# Altium footprint library 430 integreted.PcbLib: 281 footprints (part 17 of 18)
Each footprint in its own frame and in the unit in brackets; x right, y up, seen from the top. Pads: shape width x height; smd on the part's side, far side on the other; paste and mask are expansions set on the pad; w line width, h text height; cw(c..) or ccw(c..) is an arc to the next point about the centre after c.
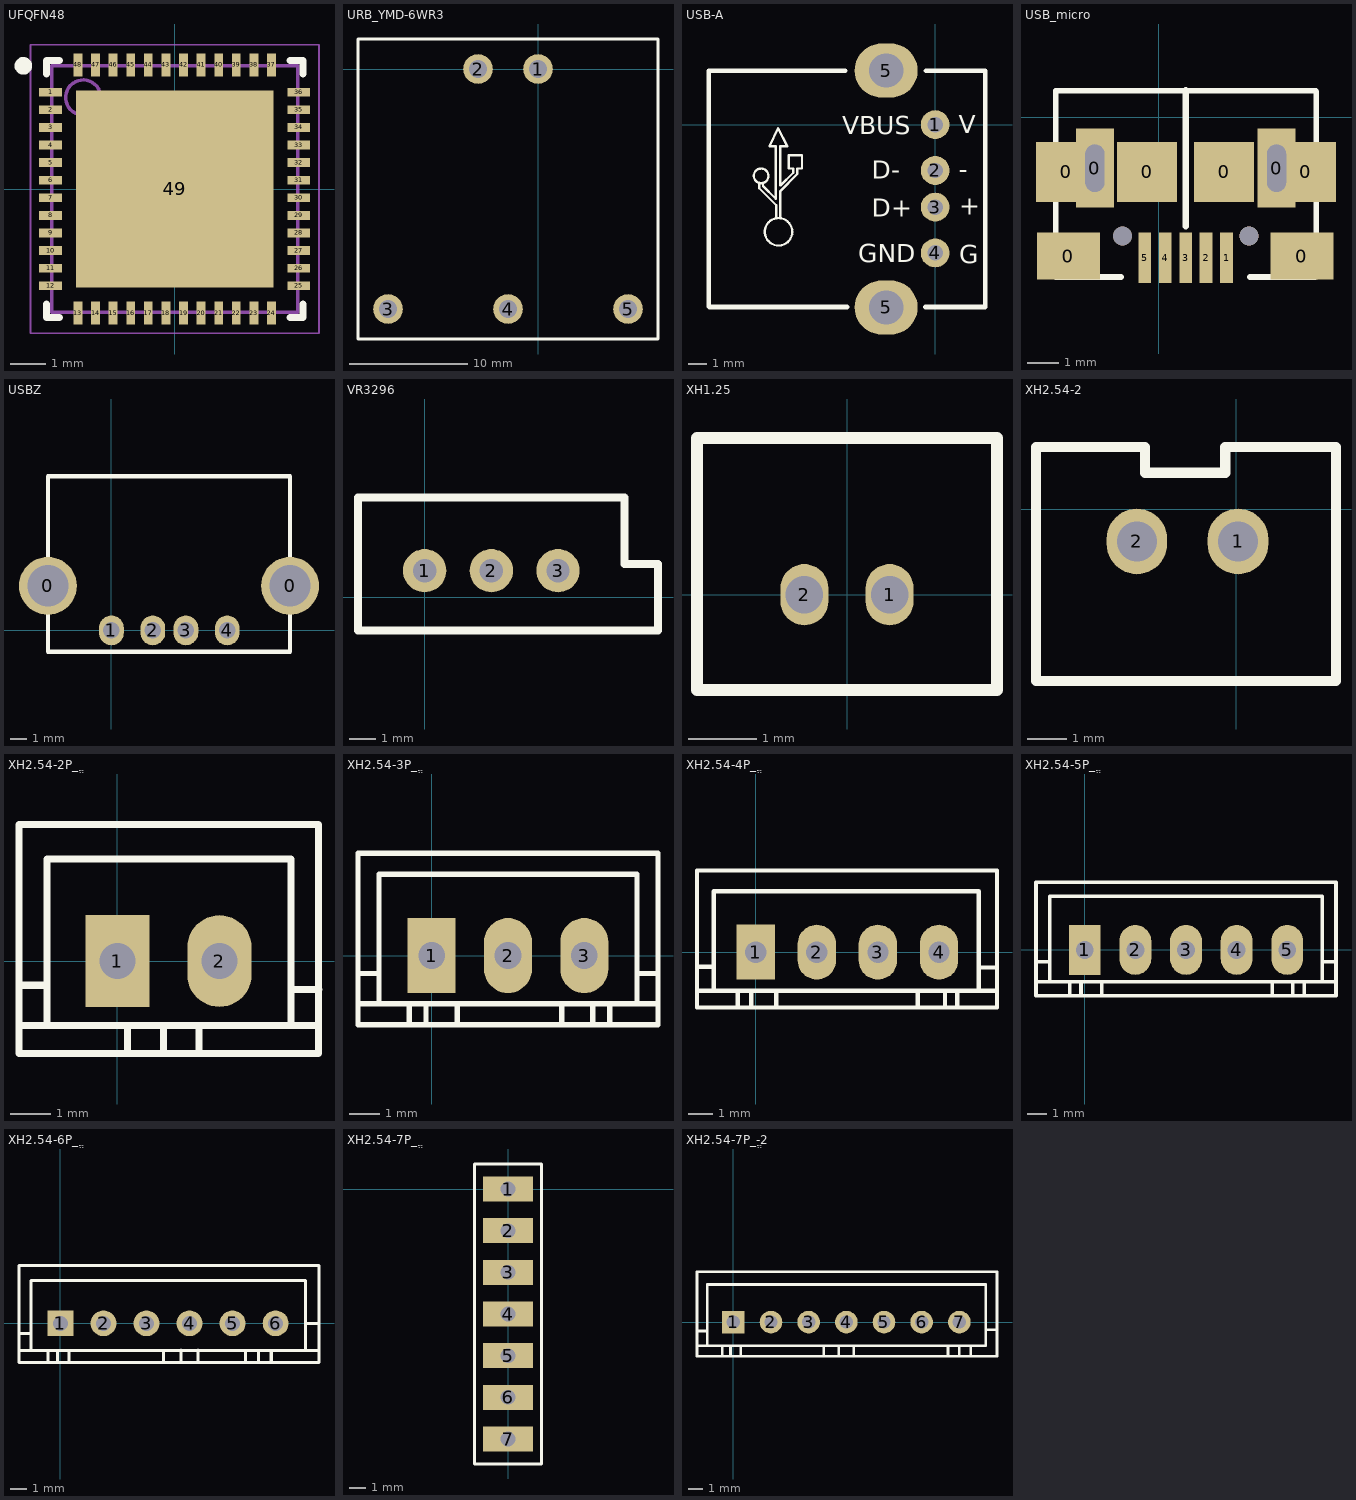
[diagram p16: the footprints below, top view; thin cyan lines are the x and y axes]

## UFQFN48 [mm]
pads (49):
  rect 0.65x0.25 smd: 1(-3.525,2.75) 2(-3.525,2.25) 3(-3.525,1.75) 4(-3.525,1.25) 5(-3.525,0.75) 6(-3.525,0.25) 7(-3.525,-0.25) 8(-3.525,-0.75) 9(-3.525,-1.25) 10(-3.525,-1.75) 11(-3.525,-2.25) 12(-3.525,-2.75) 25(3.525,-2.75) 26(3.525,-2.25) 27(3.525,-1.75) 28(3.525,-1.25) 29(3.525,-0.75) 30(3.525,-0.25) 31(3.525,0.25) 32(3.525,0.75) 33(3.525,1.25) 34(3.525,1.75) 35(3.525,2.25) 36(3.525,2.75)
  rect 0.25x0.65 smd: 13(-2.75,-3.525) 14(-2.25,-3.525) 15(-1.75,-3.525) 16(-1.25,-3.525) 17(-0.75,-3.525) 18(-0.25,-3.525) 19(0.25,-3.525) 20(0.75,-3.525) 21(1.25,-3.525) 22(1.75,-3.525) 23(2.25,-3.525) 24(2.75,-3.525) 37(2.75,3.525) 38(2.25,3.525) 39(1.75,3.525) 40(1.25,3.525) 41(0.75,3.525) 42(0.25,3.525) 43(-0.25,3.525) 44(-0.75,3.525) 45(-1.25,3.525) 46(-1.75,3.525) 47(-2.25,3.525) 48(-2.75,3.525)
  rect 5.6x5.6 smd: 49(0,0)
Top Overlay:
  circle w0.25: c-4.3,3.5 r0.125
  lines w0.2: -3.65,-3.275 -3.65,-3.65 -3.275,-3.65 ; -3.65,3.275 -3.65,3.65 -3.275,3.65 ; 3.275,-3.65 3.65,-3.65 3.65,-3.275 ; 3.275,3.65 3.65,3.65 3.65,3.275
Mechanical 13:
  circle w0.1: c-2.6,2.6 r0.5
  lines w0.1: -3.5,-3.5 -3.5,3.5 3.5,3.5 3.5,-3.5 -3.5,-3.5
Mechanical 15:
  lines w0.05: -4.1,-4.1 -4.1,4.1 4.1,4.1 4.1,-4.1 -4.1,-4.1
  lines w0.1: -0.5,0 0.5,0
3D body: height 1, standoff 0.08, extent -3.5,-3.556 3.5,3.444

## URB_YMD-6WR3 [mm]
pads (5):
  round 2.5 hole 1.5: 1(0,0) 2(-5.08,0) 3(-12.7,-20.32) 4(-2.54,-20.32) 5(7.62,-20.32)
Top Overlay:
  lines w0.254: -15.24,-22.86 -15.24,2.54 10.16,2.54 10.16,-22.86 -15.24,-22.86

## USB-A [mm]
pads (6):
  round 1.6 hole 0.85: 1(0,0) 2(0,-2.54) 3(0,-4.572) 4(0,-7.112)
  oval 3.5x3 hole 1.9: 5(-2.718,-10.135) 5(-2.718,2.997)
Top Overlay:
  circle w0.127: c-9.649,-2.843 r0.406
  circle w0.127: c-8.684,-5.941 r0.762
  lines w0.127: -9.751,-3.224 -9.751,-3.528 -8.811,-4.468 -8.811,-5.205 ; -9.547,-3.224 -9.547,-3.401 -8.836,-4.113 -8.836,-1.192 -9.192,-1.192 -8.709,-0.201 -8.201,-1.192 -8.582,-1.192 -8.582,-3.376 -7.871,-2.665 -7.871,-2.436 -8.125,-2.436 -8.125,-1.7 -7.388,-1.7 -7.388,-2.436 -7.642,-2.436 -7.642,-2.741 -8.582,-3.681 -8.582,-5.205
  lines w0.254: -12.548,2.997 -4.978,2.997 ; -12.546,2.996 -12.546,-10.085 -12.522,-10.109 -4.877,-10.109 ; -0.559,-10.109 2.769,-10.109 2.769,2.997 -0.508,2.997
  text "-" at 1.295,-2.972 h1.02
  text "+" at 1.321,-5.004 h1.02
  text "G" at 1.321,-7.696 h1.02
  text "V" at 1.295,-0.483 h1.02
  text "VBUS" at -5.156,-0.533 h1.02
  text "D-" at -3.531,-2.997 h1.02
  text "D+" at -3.531,-5.105 h1.02
  text "GND" at -4.267,-7.62 h1.02

## USB_micro [mm]
pads (13):
  rect 1.9x1.9 smd: 0(-2.934,-1.721) 0(-0.368,-1.721) 0(2.07,-1.721) 0(4.661,-1.721)
  rect 2x1.5 smd: 0(-2.857,-4.388) 0(4.534,-4.388)
  rect 1.2x2.5 hole 0.6 slot 1.5 at 90 deg: 0(-2.021,-1.607) 0(3.729,-1.607)
  rect 0.4x1.6 smd: 1(2.146,-4.438) 2(1.499,-4.438) 3(0.851,-4.438) 4(0.203,-4.438) 5(-0.444,-4.438)
via 2.858,-3.757 diameter 0.6 hole 0.6
via -1.142,-3.757 diameter 0.6 hole 0.6
Top Overlay:
  lines w0.178: -3.264,-5.048 -3.264,0.845 ; -3.238,0.845 4.966,0.845 ; 4.991,-5.048 4.991,0.819
  lines w0.2: -3.238,-5.048 -1.194,-5.048 ; 0.851,-3.448 0.851,0.856 ; 2.896,-5.048 4.94,-5.048
3D body: height 2.77, standoff -0.17, extent -3.236,-5.072 4.964,0.858

## USBZ [mm]
pads (6):
  round 3.5 hole 2.5: 0(-3.835,2.692) 0(10.795,2.692)
  oval 1.5x1.8 hole 1: 1(0,0) 2(2.5,0) 3(4.5,0) 4(7,0)
Top Overlay:
  lines w0.254: -3.835,9.322 -3.835,-1.295 10.79,-1.295 10.79,9.322 -3.81,9.322

## VQFN-48 [mm]

## VR3296 [mil]
pads (3):
  round 65 hole 35: 1(0,40) 2(100,40) 3(200,40)
Top Overlay:
  lines w12: -100,-49.96 -100,150.04 300,150.04 300,50.04 350,50.04 350,-49.96 -100,-49.96

## XH1.25 [mm]
pads (2):
  oval 0.7x0.9 hole 0.55: 1(0.625,0) 2(-0.625,0)
Top Overlay:
  lines w0.178: -2.2,-1.4 2.2,-1.4 2.2,2.3 -2.2,2.3 -2.2,-1.4

## XH2.54-2 [mil]
pads (2):
  oval 60x65 hole 39.37: 1(2,-32) 2(-98.1,-32)
Top Overlay:
  lines w10: -198,-170 99,-170 99,61.3 68.2,61.3 -10.6,61.3 -10.6,36 -90.1,36 -90.1,61.3 -198,61.3 -198,-170
3D body: height 275.59, standoff -118.11, extent -195.64,-174.11 99.64,62.11

## XH2.54-2P_ֱ [mil]
pads (2):
  rect 62.99x90 hole 35: 1(0,0)
  oval 62.99x90 hole 35: 2(100,0)
Top Overlay:
  lines w7: -96.46,-62.99 -68.9,-62.99 ; -96.46,-23.62 -68.9,-23.62 ; -96.46,133.86 -96.46,-90.55 197,-90.55 197,133.86 -96.06,133.86 ; 10,-90.55 10,-62.99 ; 45,-90.16 45,-62.99 ; 80,-90.55 80,-62.99 ; 170,-62.99 170,100 -68.9,100 -68.9,-62.99 ; 170,-28 197.56,-28 ; 196.99,-62.99 -68.9,-62.99

## XH2.54-3P_ֱ [mm]
pads (3):
  rect 1.6x2.5 hole 0.889: 1(0,0)
  oval 1.6x2.5 hole 0.889: 2(2.54,0) 3(5.08,0)
Top Overlay:
  lines w0.178: -2.45,-1.6 -1.75,-1.6 ; -2.45,-0.6 -1.75,-0.6 ; -2.45,3.4 -2.45,-2.3 7.53,-2.3 7.53,3.4 -2.44,3.4 ; -0.75,-2.3 -0.75,-1.6 ; -0.19,-2.29 -0.19,-1.6 ; 0.85,-2.3 0.85,-1.6 ; 4.33,-2.3 4.33,-1.6 ; 5.36,-2.3 5.36,-1.6 ; 5.93,-2.3 5.93,-1.6 ; 6.83,-0.6 7.53,-0.6 ; 7.53,-1.6 6.83,-1.6 ; -1.75,-1.6 -1.75,2.7 6.83,2.7 6.83,-1.6 ; -1.75,-1.6 6.83,-1.6

## XH2.54-4P_ֱ [mil]
pads (4):
  rect 62.99x90 hole 35: 1(0,0)
  oval 62.99x90 hole 35: 2(100,0) 3(200,0) 4(300,0)
Top Overlay:
  lines w7: -96.46,-62.99 -68.9,-62.99 ; -96.46,-23.62 -68.9,-23.62 ; -96.46,133.86 -96.46,-90.55 395,-90.55 395,133.86 -96.06,133.86 ; -29.53,-90.55 -29.53,-62.99 ; -7.48,-90.16 -7.48,-62.99 ; 33.47,-90.55 33.47,-62.99 ; 265,-90.55 265,-62.99 ; 310,-90.55 310,-62.99 ; 330,-90.55 330,-62.99 ; 365,-62.99 365,100 353.03,100 -68.9,100 -68.9,-62.99 ; 367.44,-25 395,-25 ; 392.99,-62.99 345.67,-62.99 337.01,-62.99 296.46,-62.99 268.9,-62.99 -68.9,-62.99

## XH2.54-5P_ֱ [mm]
pads (5):
  rect 1.6x2.5 hole 0.889 square: 1(0,0)
  oval 1.6x2.5 hole 0.889 square: 2(2.54,0) 3(5.08,0) 4(7.62,0) 5(10.16,0)
Top Overlay:
  lines w0.178: -2.45,-1.6 -1.75,-1.6 ; -2.45,-0.6 -1.75,-0.6 ; -2.45,3.4 -2.45,-2.3 12.61,-2.3 12.61,3.4 -2.44,3.4 ; -0.75,-2.3 -0.75,-1.6 ; -0.19,-2.29 -0.19,-1.6 ; 0.85,-2.3 0.85,-1.6 ; 9.41,-2.3 9.41,-1.6 ; 10.44,-2.3 10.44,-1.6 ; 11.01,-2.3 11.01,-1.6 ; 11.91,-0.6 12.61,-0.6 ; 12.61,-1.6 11.91,-1.6 ; -1.75,-1.6 11.91,-1.6 ; -1.75,-1.6 -1.75,2.7 11.91,2.7 11.91,-1.6

## XH2.54-6P_ֱ [mil]
pads (6):
  rect 60x60 hole 35: 1(0,0)
  round 60 hole 35: 2(100,0) 3(200,0) 4(300,0) 5(400,0) 6(500,0)
Top Overlay:
  lines w7: -96.46,-62.99 -68.9,-62.99 ; -96.46,-23.62 -68.9,-23.62 ; -96.46,133.86 -96.46,-90.55 601,-90.55 601,-35.45 601,60.76 601,133.86 -96.06,133.86 ; -29.53,-90.55 -29.53,-62.99 ; -7.48,-90.16 -7.48,-62.99 ; 20,-87.56 20,-62.99 ; 240,-90 240,-62.99 ; 280,-90 280,-62.44 ; 430,-90.55 430,-62.99 ; 460,-90.55 460,-62.99 ; 490,-90.55 490,-62.99 ; 570,-62.99 570,-6.99 570,73.01 570,100 353.03,100 -68.9,100 -68.9,-62.99 ; 573.44,0 601,0 ; 601,-62.99 296.46,-62.99 268.9,-62.99 -68.9,-62.99 ; 320,-90 320,-62.44 320,-90

## XH2.54-7P_ֱ [mil]
pads (7):
  rect 120x60 hole 35: 1(0,0) 2(0,-100) 3(0,-200) 4(0,-300) 5(0,-400) 6(0,-500) 7(0,-600)
Top Overlay:
  lines w7: -80,-660 80,-660 80,60 -80,60 -80,-660

## XH2.54-7P_ֱ-2 [mil]
pads (7):
  rect 60x60 hole 35: 1(0,0)
  round 60 hole 35: 2(100,0) 3(200,0) 4(300,0) 5(400,0) 6(500,0) 7(600,0)
Top Overlay:
  lines w7: -96.46,-62.99 -68.9,-62.99 ; -96.46,-23.62 -68.9,-23.62 ; -96.46,133.86 -96.46,-90.55 700,-90.55 700,63.55 700,133.86 -96.06,133.86 ; -29.53,-90.55 -29.53,-62.99 ; -7.48,-90.16 -7.48,-62.99 ; 20,-87.56 20,-62.99 ; 240,-90 240,-62.99 ; 280,-90 280,-62.44 ; 570,-90.55 570,-62.99 ; 600,-90.55 600,-62.99 ; 630,-90.55 630,-62.99 ; 670,-20 697.56,-20 ; -68.9,-62.99 -68.9,100 353.03,100 670,100 670,46.99 670,-62.99 296.46,-62.99 268.9,-62.99 -68.9,-62.99 ; 320,-90 320,-62.44 320,-90